# Altium footprint library XU-GENARAL PCB .PcbLib: 1176 footprints (part 58 of 75)
Each footprint in its own frame and in the unit in brackets; x right, y up, seen from the top. Pads: shape width x height; smd on the part's side, far side on the other; paste and mask are expansions set on the pad; w line width, h text height; cw(c..) or ccw(c..) is an arc to the next point about the centre after c.
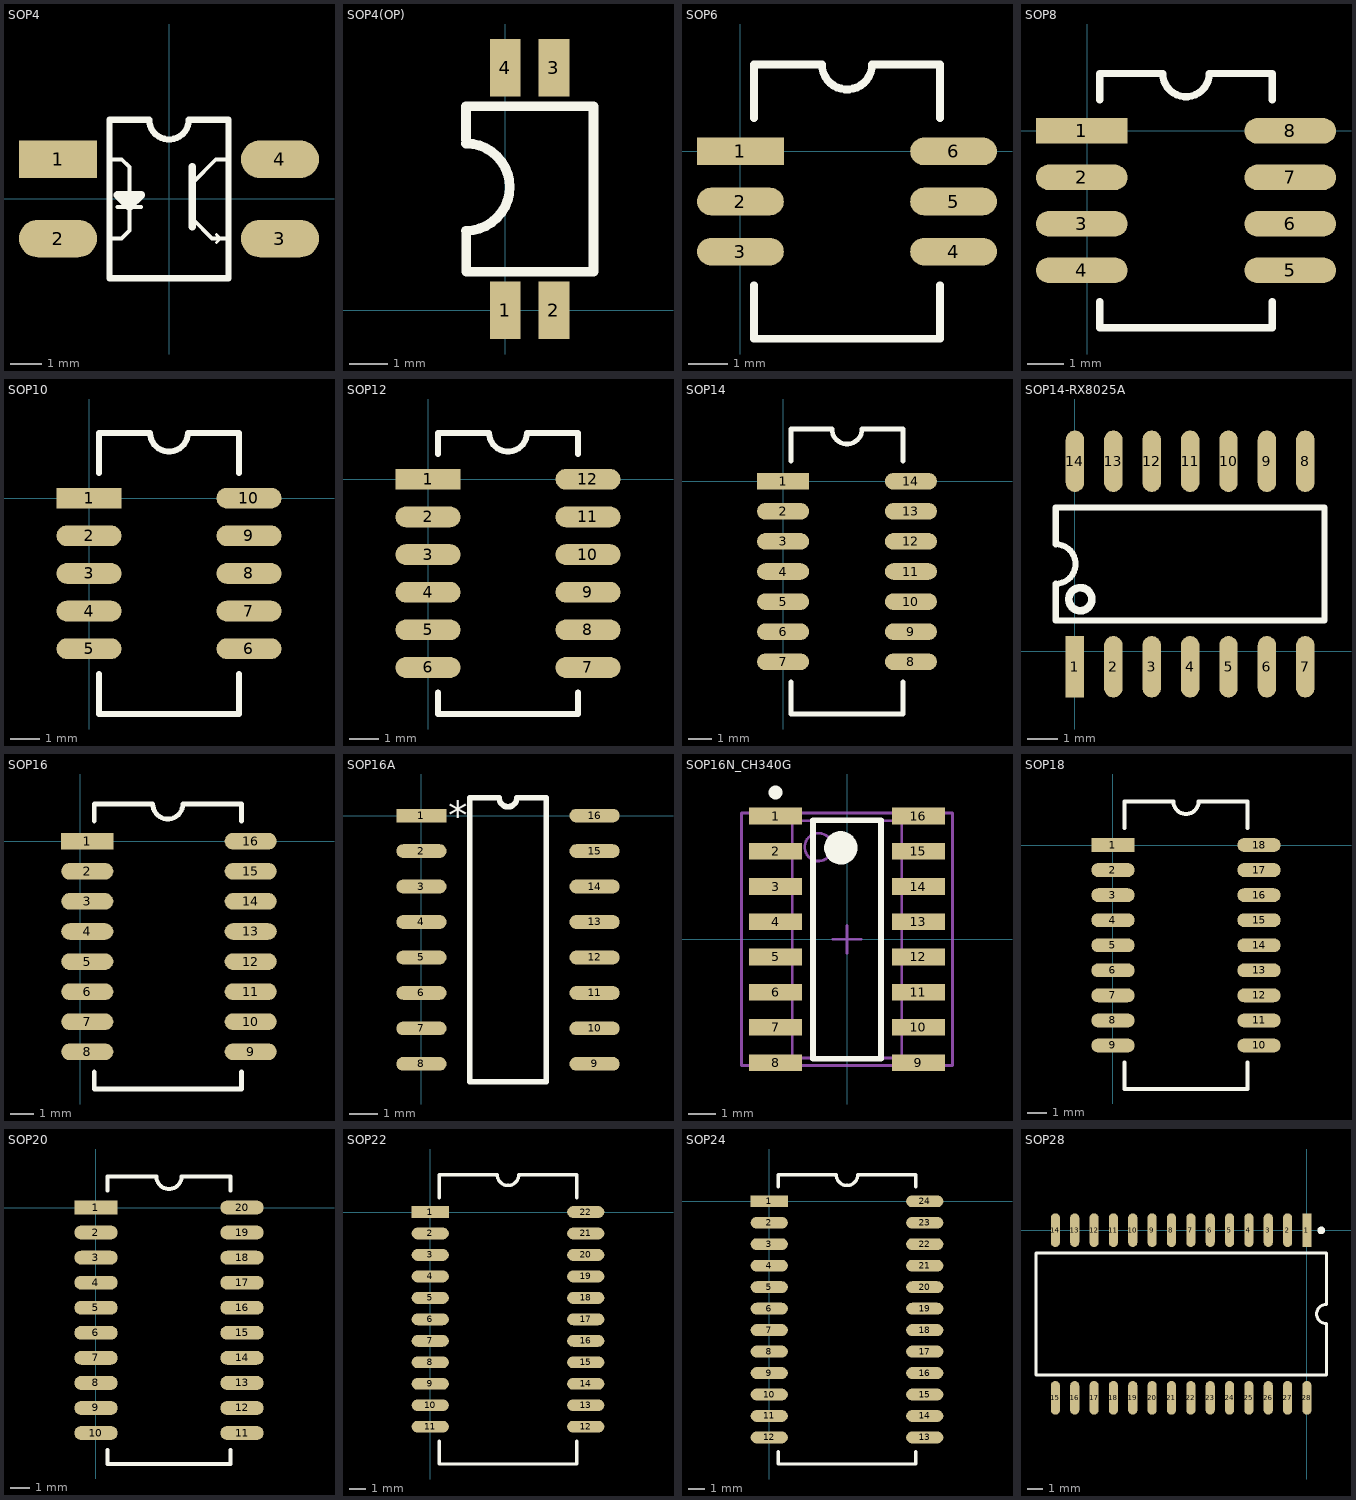
[diagram p57: the footprints below, top view; thin cyan lines are the x and y axes]

## SOP4 [mm]
height 1.1
pads (4):
  rect 2.5x1.2 smd: 1(-3.556,1.27)
  oval 2.5x1.2 smd: 2(-3.556,-1.27) 3(3.556,-1.27) 4(3.556,1.27)
Top Overlay:
  lines w0.1: 1.524,-1.397 1.651,-1.27 1.524,-1.143
  lines w0.127: -1.905,-1.27 -1.524,-1.27 -1.27,-1.016 -1.27,1.016 -1.524,1.27 -1.905,1.27 ; -1.651,-0.254 -0.889,-0.254 ; 0.746,-0.635 1.381,-1.27 1.635,-1.27 1.905,-1.27 ; 0.746,0.508 1.508,1.27 1.905,1.27
  lines w0.2: -1.905,-2.54 -1.905,2.54 -0.635,2.54 ccw(c0,2.54) 0.635,2.54 1.905,2.54 1.905,-2.54 -1.905,-2.54
  lines w0.254: 0.746,-0.889 0.746,1.016 ; -1.651,0.127 -1.524,0 -1.27,-0.254 -0.889,0.127 -1.651,0.127

## SOP4(OP) [mm]
pads (4):
  rect 0.8x1.5 smd: 1(0,0) 2(1.27,0) 3(1.27,6.3) 4(0,6.3)
Top Overlay:
  lines w0.254: -1.016,2.064 ccw(c-1.016,3.2) -1.016,4.336 ; -1.016,4.436 -1.016,5.3 2.3,5.3 2.3,1 -1.014,1 -1.014,2.03

## SOP6 [mm]
pads (6):
  rect 2.2x0.7 smd: 1(0,0)
  oval 2.2x0.7 smd: 2(0,-1.27) 3(0,-2.54) 4(5.4,-2.54) 5(5.4,-1.27) 6(5.4,0)
Top Overlay:
  lines w0.2: 0.34,-3.39 0.34,-4.745 5.06,-4.745 5.06,-3.39 ; 0.34,0.85 0.34,2.205 2.065,2.205 ccw(c2.7,2.205) 3.335,2.205 5.06,2.205 5.06,0.85

## SOP8 [mm]
pads (8):
  rect 2.5x0.7 smd: 1(-0.15,0)
  oval 2.5x0.7 smd: 2(-0.15,-1.27) 3(-0.15,-2.54) 4(-0.15,-3.81) 5(5.55,-3.81) 6(5.55,-2.54) 7(5.55,-1.27) 8(5.55,0)
Top Overlay:
  lines w0.2: 0.34,-4.66 0.34,-5.38 5.06,-5.38 5.06,-4.66 ; 0.34,0.85 0.34,1.57 2.065,1.57 ccw(c2.7,1.57) 3.335,1.57 5.06,1.57 5.06,0.85

## SOP10 [mm]
pads (10):
  rect 2.2x0.7 smd: 1(0,0)
  oval 2.2x0.7 smd: 2(0,-1.27) 3(0,-2.54) 4(0,-3.81) 5(0,-5.08) 6(5.4,-5.08) 7(5.4,-3.81) 8(5.4,-2.54) 9(5.4,-1.27) 10(5.4,0)
Top Overlay:
  lines w0.2: 0.34,-5.93 0.34,-7.285 5.06,-7.285 5.06,-5.93 ; 0.34,0.85 0.34,2.205 2.065,2.205 ccw(c2.7,2.205) 3.335,2.205 5.06,2.205 5.06,0.85

## SOP12 [mm]
pads (12):
  rect 2.2x0.7 smd: 1(0,0)
  oval 2.2x0.7 smd: 2(0,-1.27) 3(0,-2.54) 4(0,-3.81) 5(0,-5.08) 6(0,-6.35) 7(5.4,-6.35) 8(5.4,-5.08) 9(5.4,-3.81) 10(5.4,-2.54) 11(5.4,-1.27) 12(5.4,0)
Top Overlay:
  lines w0.2: 0.34,-7.2 0.34,-7.92 5.06,-7.92 5.06,-7.2 ; 0.34,0.85 0.34,1.57 2.065,1.57 ccw(c2.7,1.57) 3.335,1.57 5.06,1.57 5.06,0.85

## SOP14 [mm]
pads (14):
  rect 2.2x0.7 smd: 1(0,0)
  oval 2.2x0.7 smd: 2(0,-1.27) 3(0,-2.54) 4(0,-3.81) 5(0,-5.08) 6(0,-6.35) 7(0,-7.62) 8(5.4,-7.62) 9(5.4,-6.35) 10(5.4,-5.08) 11(5.4,-3.81) 12(5.4,-2.54) 13(5.4,-1.27) 14(5.4,0)
Top Overlay:
  lines w0.2: 0.34,-8.47 0.34,-9.825 5.06,-9.825 5.06,-8.47 ; 0.34,0.85 0.34,2.205 2.065,2.205 ccw(c2.7,2.205) 3.335,2.205 5.06,2.205 5.06,0.85

## SOP14-RX8025A [mil]
pads (14):
  rect 24x80 smd: 1(0,-20)
  oval 24x80 smd: 2(50,-20) 3(100,-20) 4(150,-20) 5(200,-20) 6(250,-20) 7(300,-20) 8(300,247.72) 9(250,247.72) 10(200,247.72) 11(150,247.72) 12(100,247.72) 13(50,247.72) 14(0,247.72)
Top Overlay:
  circle w10: c7,68 r15
  lines w7.87: -25,40.43 -25,88.11 ccw(c-25,113.86) -25,139.6 -25,187.28 325,187.28 325,40.43 -25,40.43

## SOP16 [mm]
pads (16):
  rect 2.2x0.7 smd: 1(0.3,0)
  oval 2.2x0.7 smd: 2(0.3,-1.27) 3(0.3,-2.54) 4(0.3,-3.81) 5(0.3,-5.08) 6(0.3,-6.35) 7(0.3,-7.62) 8(0.3,-8.89) 9(7.2,-8.89) 10(7.2,-7.62) 11(7.2,-6.35) 12(7.2,-5.08) 13(7.2,-3.81) 14(7.2,-2.54) 15(7.2,-1.27) 16(7.2,0)
Top Overlay:
  lines w0.2: 0.59,-9.74 0.59,-10.46 6.81,-10.46 6.81,-9.74 ; 0.59,0.85 0.59,1.57 3.065,1.57 ccw(c3.7,1.57) 4.335,1.57 6.81,1.57 6.81,0.85

## SOP16A [mm]
pads (16):
  rect 1.8x0.49 smd: 1(0,0)
  oval 1.8x0.49 smd: 2(0,-1.27) 3(0,-2.54) 4(0,-3.81) 5(0,-5.08) 6(0,-6.35) 7(0,-7.62) 8(0,-8.89) 9(6.2,-8.89) 10(6.2,-7.62) 11(6.2,-6.35) 12(6.2,-5.08) 13(6.2,-3.81) 14(6.2,-2.54) 15(6.2,-1.27) 16(6.2,0)
Top Overlay:
  lines w0.2: 1.735,-9.525 4.465,-9.525 4.465,0.635 3.417,0.635 cw(c3.1,0.635) 2.782,0.635 1.735,0.635 1.735,-9.525
  text "*" at 0.965,-0.483 h1.02

## SOP16N_CH340G [mm] "SOIC, 16-Leads, Body 8.6x4.0mm (max), Pitch 1.27mm, IPC Medium Density"
height 1.7
pads (16):
  rect 1.9x0.6 smd: 1(-2.575,4.445) 2(-2.575,3.175) 3(-2.575,1.905) 4(-2.575,0.635) 5(-2.575,-0.635) 6(-2.575,-1.905) 7(-2.575,-3.175) 8(-2.575,-4.445) 9(2.575,-4.445) 10(2.575,-3.175) 11(2.575,-1.905) 12(2.575,-0.635) 13(2.575,0.635) 14(2.575,1.905) 15(2.575,3.175) 16(2.575,4.445)
Top Overlay:
  circle w0.25: c-2.575,5.295 r0.125
  circle w0.6: c-0.225,3.3 r0.3
  lines w0.2: -1.225,-4.3 -1.225,4.3 1.225,4.3 1.225,-4.3 -1.225,-4.3
Mechanical 13:
  circle w0.1: c-1.025,3.325 r0.5
  lines w0.1: -1.975,-4.275 -1.975,4.275 1.975,4.275 1.975,-4.275 -1.975,-4.275
Mechanical 15:
  lines w0.1: -0.5,0 0.5,0 ; 0,-0.5 0,0.5 ; -3.8,-4.55 -3.8,4.55 3.8,4.55 3.8,-4.55 -3.8,-4.55
3D body: height 1.7, standoff 0.16, extent -1.975,-4.275 1.975,4.275

## SOP18 [mm]
pads (18):
  rect 2.2x0.7 smd: 1(0,0)
  oval 2.2x0.7 smd: 2(0,-1.27) 3(0,-2.54) 4(0,-3.81) 5(0,-5.08) 6(0,-6.35) 7(0,-7.62) 8(0,-8.89) 9(0,-10.16) 10(7.4,-10.16) 11(7.4,-8.89) 12(7.4,-7.62) 13(7.4,-6.35) 14(7.4,-5.08) 15(7.4,-3.81) 16(7.4,-2.54) 17(7.4,-1.27) 18(7.4,0)
Top Overlay:
  lines w0.2: 0.59,-11.01 0.59,-12.365 6.81,-12.365 6.81,-11.01 ; 0.59,0.85 0.59,2.205 3.065,2.205 ccw(c3.7,2.205) 4.335,2.205 6.81,2.205 6.81,0.85

## SOP20 [mm]
pads (20):
  rect 2.2x0.7 smd: 1(0,0)
  oval 2.2x0.7 smd: 2(0,-1.27) 3(0,-2.54) 4(0,-3.81) 5(0,-5.08) 6(0,-6.35) 7(0,-7.62) 8(0,-8.89) 9(0,-10.16) 10(0,-11.43) 11(7.4,-11.43) 12(7.4,-10.16) 13(7.4,-8.89) 14(7.4,-7.62) 15(7.4,-6.35) 16(7.4,-5.08) 17(7.4,-3.81) 18(7.4,-2.54) 19(7.4,-1.27) 20(7.4,0)
Top Overlay:
  lines w0.2: 0.59,-12.28 0.59,-13 6.81,-13 6.81,-12.28 ; 0.59,0.85 0.59,1.57 3.065,1.57 ccw(c3.7,1.57) 4.335,1.57 6.81,1.57 6.81,0.85

## SOP22 [mm]
pads (22):
  rect 2.2x0.7 smd: 1(0,0)
  oval 2.2x0.7 smd: 2(0,-1.27) 3(0,-2.54) 4(0,-3.81) 5(0,-5.08) 6(0,-6.35) 7(0,-7.62) 8(0,-8.89) 9(0,-10.16) 10(0,-11.43) 11(0,-12.7) 12(9.2,-12.7) 13(9.2,-11.43) 14(9.2,-10.16) 15(9.2,-8.89) 16(9.2,-7.62) 17(9.2,-6.35) 18(9.2,-5.08) 19(9.2,-3.81) 20(9.2,-2.54) 21(9.2,-1.27) 22(9.2,0)
Top Overlay:
  lines w0.2: 0.535,-13.55 0.535,-14.905 8.665,-14.905 8.665,-13.55 ; 0.535,0.85 0.535,2.205 3.965,2.205 ccw(c4.6,2.205) 5.235,2.205 8.665,2.205 8.665,0.85

## SOP24 [mm]
pads (24):
  rect 2.2x0.7 smd: 1(0,0)
  oval 2.2x0.7 smd: 2(0,-1.27) 3(0,-2.54) 4(0,-3.81) 5(0,-5.08) 6(0,-6.35) 7(0,-7.62) 8(0,-8.89) 9(0,-10.16) 10(0,-11.43) 11(0,-12.7) 12(0,-13.97) 13(9.2,-13.97) 14(9.2,-12.7) 15(9.2,-11.43) 16(9.2,-10.16) 17(9.2,-8.89) 18(9.2,-7.62) 19(9.2,-6.35) 20(9.2,-5.08) 21(9.2,-3.81) 22(9.2,-2.54) 23(9.2,-1.27) 24(9.2,0)
Top Overlay:
  lines w0.2: 0.535,-14.82 0.535,-15.54 8.665,-15.54 8.665,-14.82 ; 0.535,0.85 0.535,1.57 3.965,1.57 ccw(c4.6,1.57) 5.235,1.57 8.665,1.57 8.665,0.85

## SOP28 [mm]
pads (28):
  rect 0.6x2.2 smd: 1(0,0)
  oval 0.6x2.2 smd: 2(-1.27,0) 3(-2.54,0) 4(-3.81,0) 5(-5.08,0) 6(-6.35,0) 7(-7.62,0) 8(-8.89,0) 9(-10.16,0) 10(-11.43,0) 11(-12.7,0) 12(-13.97,0) 13(-15.24,0) 14(-16.51,0) 15(-16.51,-11) 16(-15.24,-11) 17(-13.97,-11) 18(-12.7,-11) 19(-11.43,-11) 20(-10.16,-11) 21(-8.89,-11) 22(-7.62,-11) 23(-6.35,-11) 24(-5.08,-11) 25(-3.81,-11) 26(-2.54,-11) 27(-1.27,-11) 28(0,-11)
Top Overlay:
  circle w0.25: c0.938,-0.014 r0.125
  lines w0.2: -17.78,-9.5 -17.78,-1.5 1.27,-1.5 1.27,-4.865 ccw(c1.27,-5.5) 1.27,-6.135 1.27,-9.5 -17.78,-9.5